# Altium footprint library PcbLib1.PcbLib: 19 footprints (part 1 of 2)
Each footprint in its own frame and in the unit in brackets; x right, y up, seen from the top. Pads: shape width x height; smd on the part's side, far side on the other; paste and mask are expansions set on the pad; w line width, h text height; cw(c..) or ccw(c..) is an arc to the next point about the centre after c.
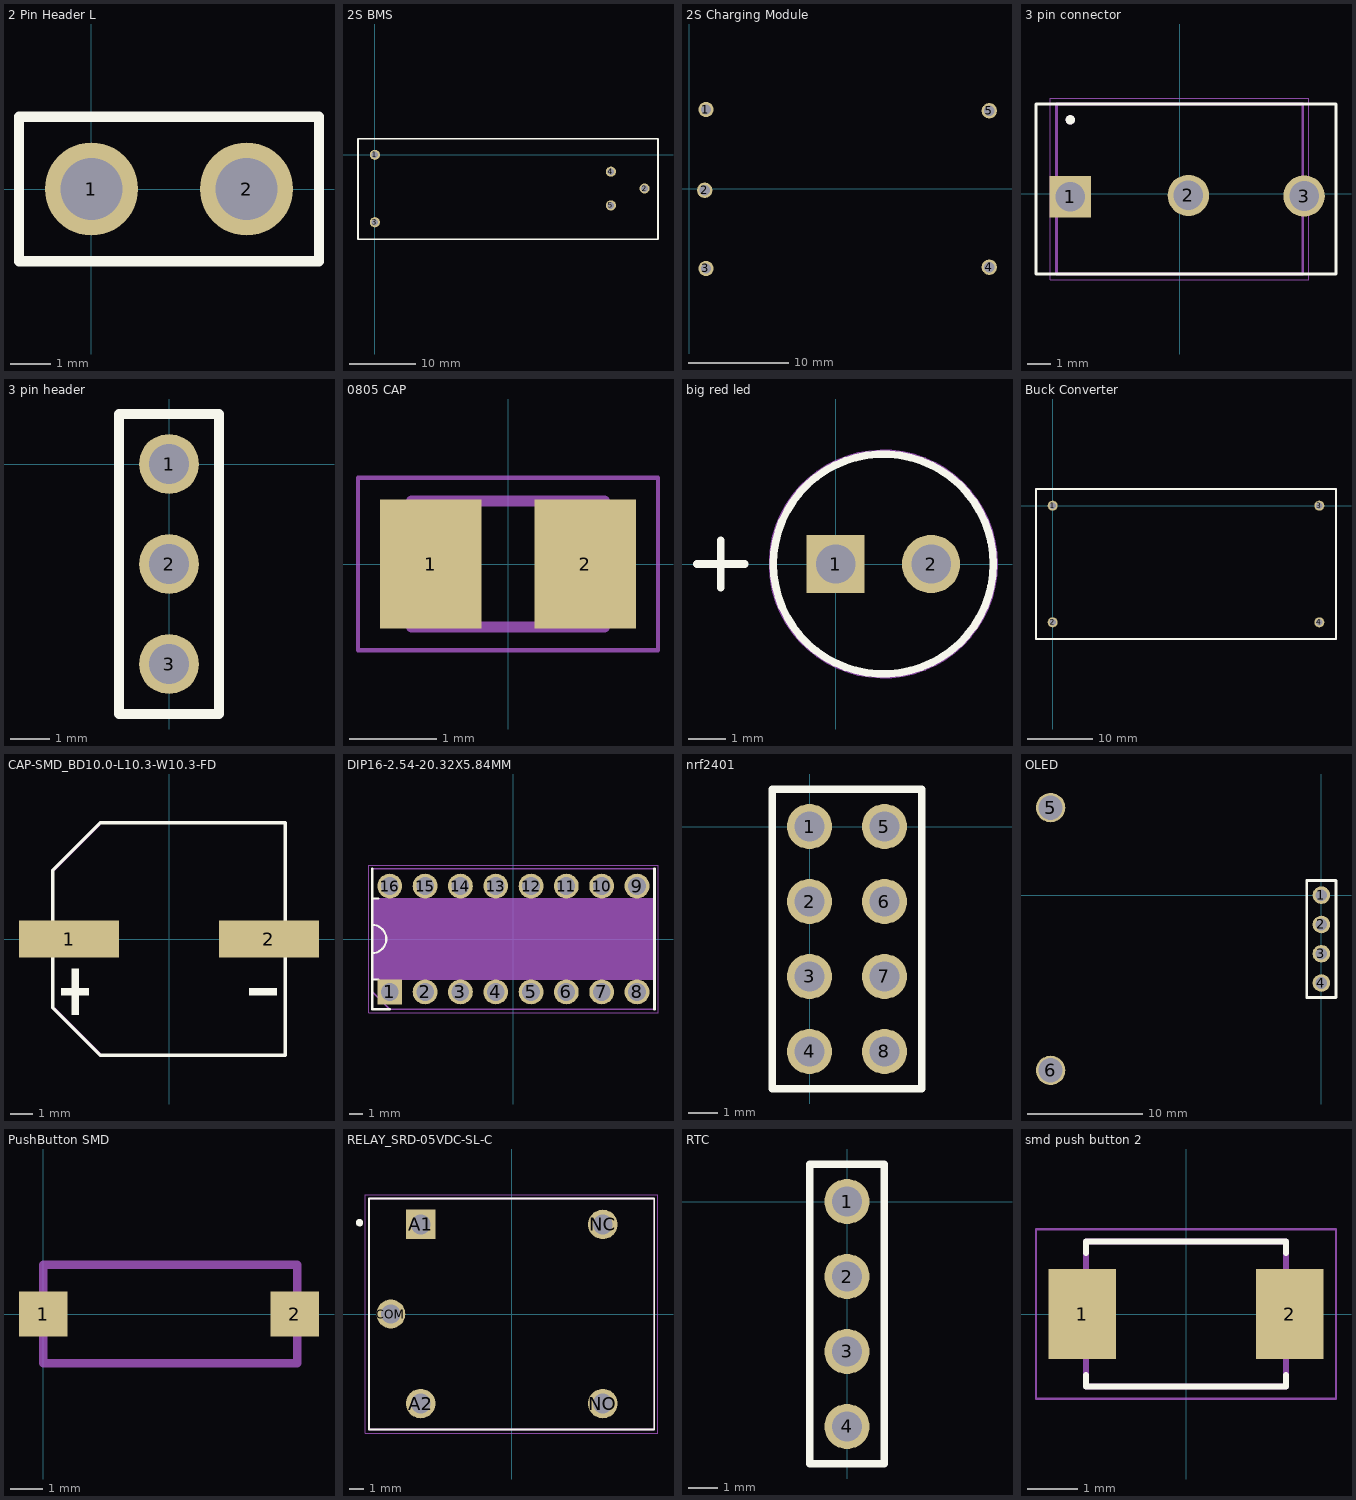
[diagram p0: the footprints below, top view; thin cyan lines are the x and y axes]

## 2 Pin Header L [mil]
pads (2):
  round 90 hole 60: 1(0,0) 2(150,0)
Top Overlay:
  lines w10: -70,-70 220,-70 220,70 -70,70 -70,-70

## 2S BMS [mil]
pads (5):
  round 60 hole 40: 1(0,0) 2(1600,-200) 3(0,-400) 4(1400,-100) 5(1400,-300)
Top Overlay:
  lines w10: -100,-500 1679.53,-500 1679.53,94.49 -100,94.49 -100,-500
3D body "HW-391 2S 20A BMS v1.step": height 190.55, standoff 60.22, extent -100,-500.28 1683.46,90.28

## 2S Charging Module [mil]
pads (5):
  round 60 hole 40: 1(65,310) 2(60,-5) 3(65,-310) 4(1170,-305) 5(1170,305)
3D body "LX-LISC-V1 v1.step": height 166.3, standoff 0, extent 6.3,-368.7 1257.4,359.65

## 3 pin connector [mil]
pads (3):
  rect 70x70 hole 50: 1(-185,-5)
  round 70 hole 50: 2(15,-3) 3(211,-4)
Top Overlay:
  circle w7.87: c-185,125 r3.94
  lines w5: -243,-135.83 265,-135.83 265,151.57 -243,151.57 -243,-135.83
Mechanical 13:
  circle w7.87: c-185,125 r3.94
  lines w5: -208.66,-135.83 208.66,-135.83 208.66,151.57 -208.66,151.57 -208.66,-135.83
Mechanical 15:
  lines w1.97: -218.5,-145.67 218.5,-145.67 218.5,161.42 -218.5,161.42 -218.5,-145.67
3D body "TerminalBlock3Position.SLDPRT": height 393.81, standoff -129.92, extent -282.28,-171.54 320.09,135.54

## 3 pin header [mil]
pads (3):
  round 60 hole 40: 1(0,0) 2(0,-100) 3(0,-200)
Top Overlay:
  lines w10: -50,-250 50,-250 50,50 -50,50 -50,-250

## 0805 CAP [mm]
pads (2):
  rect 1.16x1.47 smd: 1(-0.88,0) 2(0.88,0)
Mechanical 13:
  lines w0.127: -1.1,-0.72 1.1,-0.72 1.1,0.72 -1.1,0.72 -1.1,-0.72
Mechanical 15:
  lines w0.05: -1.713,-0.983 1.713,-0.983 1.713,0.983 -1.713,0.983 -1.713,-0.983
3D body "step_temp.STEP": height 0.94, standoff 0, extent -1.005,-0.625 1.005,0.625

## big red led [mm] "THD, 2-Leads, Body Dia 5.85mm"
pads (2):
  rect 1.55x1.55 hole 1.05: 1(0,0)
  round 1.55 hole 1.05: 2(2.54,0)
Top Overlay:
  circle w0.2: c1.27,0 r2.923
  lines w0.2: -3.683,0 -2.413,0 ; -3.048,-0.635 -3.048,0.635
Mechanical 13:
  circle w0.1: c1.27,0 r2.923
Mechanical 15:
  circle w0.05: c1.27,0 r3.023
3D body "LED 3mm Red 21mm Leads.step": height 23.39, standoff -2.99, extent -0.701,-1.945 2.794,1.905

## Buck Converter [mil]
pads (4):
  round 60 hole 40: 1(0,0) 2(0,-700) 3(1600,0) 4(1600,-700)
Top Overlay:
  lines w10: -100,-800 1700,-800 1700,100 -100,100 -100,-800
Mechanical 1:
  lines w10: -100,-800 1700,-800 1700,100 -100,100 -100,-800
3D body "XL4005_MODELO_3D_1.step": height 568.5, standoff 52.36, extent -68.19,-778.43 1664.09,73.62

## CAP-SMD_BD10.0-L10.3-W10.3-FD [mm]
pads (2):
  rect 4.5x1.65 smd: 1(-4.5,0) 2(4.5,0)
Top Overlay:
  region: 4.841,-2.214 4.841,-2.523 3.605,-2.523 3.605,-2.214
  region: -4.841,-2.214 -4.841,-2.523 -3.605,-2.523 -3.605,-2.214
  region: -4.378,-1.339 -4.378,-3.399 -4.068,-3.399 -4.068,-1.339
  lines w0.152: -5.226,-0.852 -5.226,-3.09 -3.09,-5.226 5.226,-5.226 5.226,-0.852 ; -5.226,0.852 -5.226,3.09 -3.09,5.226 5.226,5.226 5.226,0.852
Mechanical 15:
  lines w0.051: -5.15,-3.09 -3.09,-5.15 ; -5.15,3.09 -3.09,5.15

## DIP16-2.54-20.32X5.84MM [mil]
pads (16):
  rect 70x70 hole 50: 1(-350,-150)
  round 70 hole 50: 2(-250,-150) 3(-150,-150) 4(-50,-150) 5(50,-150) 6(150,-150) 7(250,-150) 8(350,-150) 9(350,150) 10(250,150) 11(150,150) 12(50,150) 13(-50,150) 14(-150,150) 15(-250,150) 16(-350,150)
Top Overlay:
  lines w5: -400,-115 -381.89,-115 ; -400,115 -381.89,115
  lines w6: -400,-115 -400,-40 ccw(c-400,0) -400,40 -400,115
  lines w7.87: -399.61,198.82 -399.61,-198.82 -350,-198.82 ; 399.61,-198.82 399.61,198.82
Mechanical 13:
  lines w3.94: -399.61,-148.82 -349.61,-198.82 ; -399.61,-198.82 399.61,-198.82 399.61,198.82 -399.61,198.82 -399.61,-198.82
Mechanical 15:
  region: 400,-115.08 -400.3,-115.08 -400.3,115 400,115
  lines w1.97: -409.45,-208.66 409.45,-208.66 409.45,208.66 -409.45,208.66 -409.45,-208.66
3D body "step_temp.STEP": height 285.35, standoff -10.91, extent -374.51,-185.88 374.51,185.88
3D body "110-87-316-41-001101.stp": height 135.72, standoff -154.48, extent -399.61,-198.82 399.61,198.82

## nrf2401 [mil]
pads (8):
  round 60 hole 40: 1(0,0) 2(0,-100) 3(0,-200) 4(0,-300) 5(100,0) 6(100,-100) 7(100,-200) 8(100,-300)
Top Overlay:
  lines w10: -50,-350 150,-350 150,50 -50,50 -50,-350
3D body "NRF24l01_with_antenna.STEP": height 3660.96, standoff -224.41, extent -82.09,-450.2 2829.94,150.2

## OLED [mil]
pads (6):
  round 60 hole 40: 1(0,0) 2(0,-100) 3(0,-200) 4(0,-300)
  round 100 hole 82.68: 5(-925.2,299.21) 6(-925.2,-598.43)
Top Overlay:
  lines w10: -50,-350 50,-350 50,50 -50,50 -50,-350
3D body "Pantalla OLED 0.96'' 128x64.stp": height 318.11, standoff -114.96, extent -1039.37,-712.6 39.37,405.51

## PushButton SMD [mm]
pads (2):
  rect 1.5x1.4 smd: 1(0,0) 2(7.8,0)
Mechanical 1:
  lines w0.254: 0,-1.524 7.874,-1.524 7.874,1.524 0,1.524 0,-1.524

## RELAY_SRD-05VDC-SL-C [mm]
pads (5):
  rect 1.98x1.98 / inner round 1.98 / far side rect 1.98x1.98 hole 1.32: A1(-6.1,6)
  round 1.98 hole 1.32: A2(-6.1,-6) NC(6.1,6) NO(6.1,-6)
  round 1.935 hole 1.29: COM(-8.1,0)
Top Overlay:
  circle w0.3: c-10.2,6.119 r0.1
  lines w0.127: -9.55,-7.75 9.55,-7.75 9.55,7.75 -9.55,7.75 -9.55,-7.75
Mechanical 13:
  lines w0.127: -9.55,-7.75 9.55,-7.75 9.55,7.75 -9.55,7.75 -9.55,-7.75
Mechanical 15:
  lines w0.05: -9.8,-8 9.8,-8 9.8,8 -9.8,8 -9.8,-8
3D body "step_temp.STEP": height 15.8, standoff -3, extent -9.6,-7.8 9.6,7.8

## RTC [mil]
pads (4):
  round 60 hole 40: 1(0,0) 2(0,-100) 3(0,-200) 4(0,-300)
Top Overlay:
  lines w10: -50,-350 50,-350 50,50 -50,50 -50,-350

## smd push button 2 [mm]
height 2
pads (2):
  rect 1.35x1.8 smd: 1(-2.075,0) 2(2.075,0)
Top Overlay:
  lines w0.127: -2,-1.22 -2,-1.45 2,-1.45 2,-1.22 ; -2,1.22 -2,1.45 2,1.45 2,1.22
Mechanical 13:
  lines w0.127: -2,-1.45 -2,1.45 2,1.45 2,-1.45 -2,-1.45
Mechanical 15:
  lines w0.05: -3,-1.7 3,-1.7 3,1.7 -3,1.7 -3,-1.7
3D body "step_temp.STEP": height 2, standoff 0, extent -2.4,-1.45 2.4,1.45